# Altium footprint library Wireless Security Board.PcbLib: 38 footprints (part 3 of 3)
Each footprint in its own frame and in the unit in brackets; x right, y up, seen from the top. Pads: shape width x height; smd on the part's side, far side on the other; paste and mask are expansions set on the pad; w line width, h text height; cw(c..) or ccw(c..) is an arc to the next point about the centre after c.
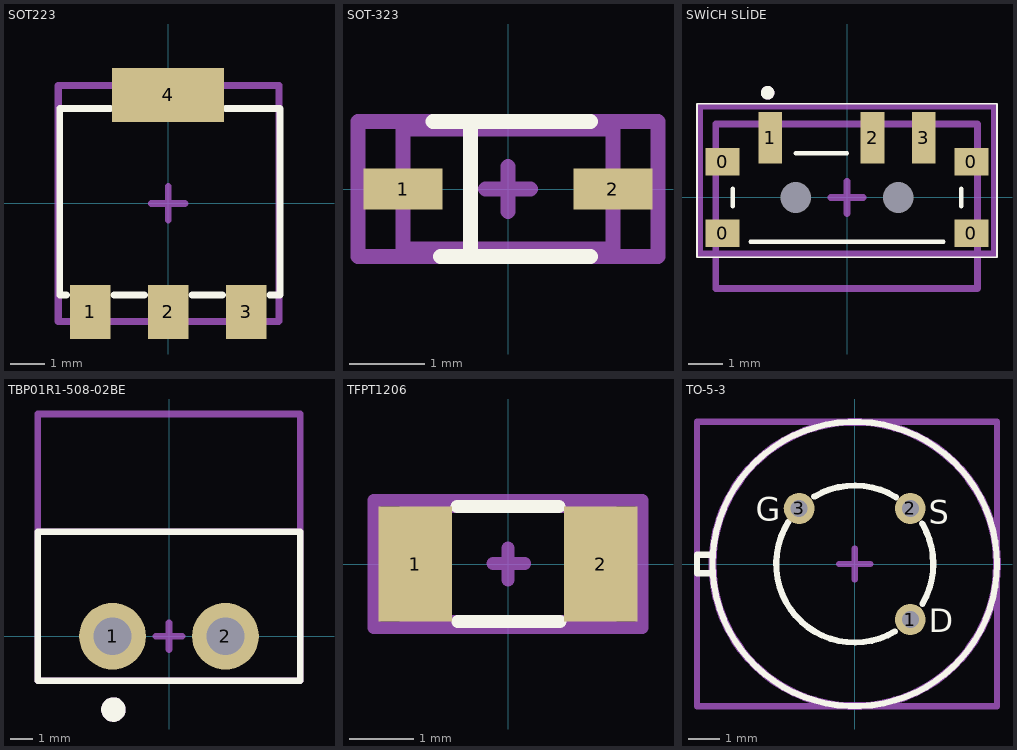
[diagram p2: the footprints below, top view; thin cyan lines are the x and y axes]

## SOT223 [mm]
pads (4):
  rect 1.2x1.6 smd mask+0.05: 1(-2.3,-3.2) 2(0,-3.2) 3(2.3,-3.2)
  rect 3.3x1.6 smd mask+0.05: 4(0,3.2)
Top Overlay:
  lines w0.2: -3,-2.7 -3.2,-2.7 -3.2,2.8 -1.7,2.8 ; -1.6,-2.7 -0.7,-2.7 ; 0.7,-2.7 1.6,-2.7 ; 1.7,2.8 3.3,2.8 3.3,-2.7 3,-2.7
Top 3D Body:
  lines w0.2: -3.25,-3.48 3.26,-3.48 3.26,3.48 -3.25,3.48 -3.25,-3.475
Top Component Center:
  lines w0.2: -0.5,0 0.5,0 ; 0,-0.5 0,0.5 ; -3.25,-3.475 -3.25,3.475 3.275,3.475 3.275,-3.475 -3.25,-3.475
Top Designator:
  lines w0.2: -3.225,-3.475 -3.225,3.475 3.275,3.475 3.275,-3.475 -3.225,-3.475
  text ".Designator" at -2.225,-0.392 h1
3D body "CircuitWorks-SOT-223.STEP": height 1.7, standoff 0.02, extent -3.25,-3.48 3.25,3.48

## SOT-323 [mm]
pads (2):
  rect 1.05x0.55 smd mask+0.05: 1(-1.4,0) 2(1.4,0)
Top Overlay:
  lines w0.2: -1,0.9 1.1,0.9 ; -0.9,-0.9 1.1,-0.9 ; -0.5,-0.9 -0.5,0.9
Top 3D Body:
  lines w0.2: -1.4,-0.8 -1.4,0.8 1.4,0.8 1.4,-0.8 -1.4,-0.8
Top Component Center:
  lines w0.2: -0.3,0 0.3,0 ; 0,-0.3 0,0.3 ; -2,-0.9 -2,0.9 2,0.9 2,-0.9 -2,-0.9
Top Designator:
  lines w0.2: -2,-0.9 2,-0.9 2,0.9 -2,0.9 -2,-0.9
  text ".Designator" at -1.4,-0.25 h0.75
3D body "SOD-323.STEP": height 1.17, standoff 0.02, extent -1.35,-0.723 1.35,0.723

## SWİCH SLİDE [mm]
pads (9):
  rect 1x0.8 smd: 0(-3.65,-1.05) 0(-3.65,1.05) 0(3.65,-1.05) 0(3.65,1.05)
  rect 0.7x1.5 smd: 1(-2.25,1.75) 2(0.75,1.75) 3(2.25,1.75)
  round 0 hole 0.9 unplated: ""(-1.5,0) ""(1.5,0)
Top Overlay:
  circle w0.2: c-2.329,3.071 r0.1
  lines w0.05: -4.4,-1.75 4.4,-1.75 4.4,2.75 -4.4,2.75 -4.4,-1.75
  lines w0.127: -3.35,-0.254 -3.35,0.254 ; -2.83,-1.3 2.83,-1.3 ; -1.5,1.3 0,1.3 ; 3.35,-0.254 3.35,0.254
Top 3D Body:
  circle w0.2: c-2.329,3.071 r0.1
  lines w0.2: -3.85,-2.675 -3.85,2.15 3.825,2.15 3.825,-2.675 -3.85,-2.675
Top Component Center:
  lines w0.2: -0.475,0 0.475,0 ; 0,-0.475 0,0.475 ; -4.325,-1.65 -4.325,2.675 4.325,2.675 4.325,-1.65 -4.325,-1.65
Top Designator:
  lines w0.2: -4.325,2.675 -4.325,2.675 ; -4.325,2.675 4.325,2.675 4.325,-1.65 -4.325,-1.65 -4.325,2.675
  text ".Designator" at -3.35,-1.267 h2.5
3D body "step_temp.STEP": height 1.45, standoff -0.25, extent -3.85,-2.7 3.85,2.2

## TBP01R1-508-02BE [mm] "TERMINAL BLOCK, PLUGGABLE, 5.08,"
pads (2):
  round 3 hole 1.7 mask+0.05: 1(-2.54,0) 2(2.54,0)
Top Overlay:
  circle w0.7: c-2.5,-3.3 r0.2
  lines w0.3: -5.9,-2 5.9,-2 5.9,4.7 -5.9,4.7 -5.9,-2
Top 3D Body:
  circle w0.7: c-2.5,-3.3 r0.2
  lines w0.3: -5.9,-2 -5.9,10 5.9,10 5.9,-2 -5.9,-2
Top Component Center:
  lines w0.3: -0.6,0 0.6,0 ; 0,-0.6 0,0.6 ; -5.9,-2 5.9,-2 5.9,4.7 -5.9,4.7 -5.9,-2
Top Designator:
  lines w0.3: -5.9,-2 5.9,-2 5.9,4.7 -5.9,4.7 -5.9,-2
  text ".Designator" at -5.15,-0.017 h2.5
3D body "CUI_DEVICES_TBP01R1-508-02BE.step": height 8.7, standoff -3.8, extent -5.86,-2 5.9,10

## TFPT1206 [mm]
pads (2):
  rect 1.15x1.8 smd mask+0.05: 1(-1.45,0) 2(1.45,0)
Top Overlay:
  lines w0.2: -0.8,0.9 0.8,0.9 ; -0.786,-0.903 0.814,-0.903
Top 3D Body:
  lines w0.2: -1.6,-0.9 1.6,-0.9 1.6,0.9 -1.6,0.9 -1.6,-0.9
Top Component Center:
  lines w0.2: -0.236,0.007 0.264,0.007 ; 0,-0.25 0,0.25 ; -2.1,-1 2.1,-1 2.1,1 -2.1,1 -2.1,-1
Top Designator:
  lines w0.2: -2.1,-1 2.1,-1 2.1,1 -2.1,1 -2.1,-1
  text ".Designator" at -1.6,-0.2 h0.6
3D body "TR_1002FM_VIS.step": height 0.66, standoff 0, extent -1.6,-0.826 1.6,0.826

## TO-5-3 [mm] "LHI 878"
pads (3):
  round 1 hole 0.55 mask+0.05: 1(1.796,-1.796) 2(1.796,1.796) 3(-1.796,1.796)
Top Overlay:
  circle w0.2: c0,0 r4.6
  lines w0.2: -4.6,-0.3 -5.1,-0.3 -5.1,0.3 -4.6,0.3 ; -2.148,1.356 ccw(c0,0) 1.307,-2.178 ; -1.307,2.178 cw(c0,0) 1.337,2.16 ; 2.178,1.307 cw(c0,0) 2.187,-1.292
  text "G" at -3.2,1.4 h0.75
  text "D" at 2.4,-2.2 h0.75
  text "S" at 2.4,1.3 h0.75
Top 3D Body:
  lines w0.2: -5.1,-4.6 4.6,-4.6 4.6,4.6 -5.1,4.6 -5.1,-4.6
Top Component Center:
  circle w0.254: c0,0 r4.6
  lines w0.2: -0.5,0 0.5,0 ; 0,-0.5 0,0.5
Top Designator:
  circle w0.2: c0,0 r4.6
  text ".Designator" at -1.45,-0.517 h1
3D body "User Library-LHI878-1.step": height 4.5, standoff -4.9, extent -5.081,-4.599 4.6,4.599